# Altium footprint library LPEDT_Pulse_Project_PCB_Library.PcbLib: 34 footprints (part 3 of 3)
Each footprint in its own frame and in the unit in brackets; x right, y up, seen from the top. Pads: shape width x height; smd on the part's side, far side on the other; paste and mask are expansions set on the pad; w line width, h text height; cw(c..) or ccw(c..) is an arc to the next point about the centre after c.
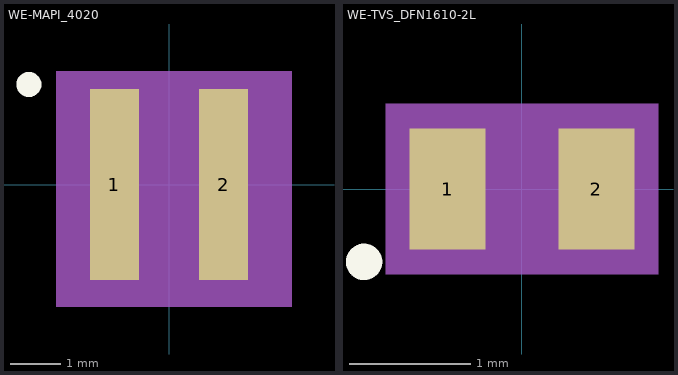
[diagram p2: the footprints below, top view; thin cyan lines are the x and y axes]

## WE-MAPI_4020 [mm]
pads (2):
  rect 0.98x3.81 smd: 1(-1.092,0) 2(1.092,0)
Top Overlay:
  circle w0.3: c-2.8,2 r0.1
Mechanical 13:
  lines w0.1: -2.05,-2.05 2.05,-2.05 2.05,2.05 -2.05,2.05 -2.05,-2.05
  lines w0.2: -2.15,-2.15 -2.15,2.15 2.15,2.15 2.15,-2.15 -2.15,-2.15
Mechanical 15:
  region: 2.452,-2.439 -2.248,-2.439 -2.248,2.261 2.452,2.261
3D body "Download_STP_WE-MAPI_4020+(rev1).stp": height 2.08, standoff -0.02, extent -2.05,-2.05 2.05,2.05

## WE-TVS_DFN1610-2L [mm]
pads (2):
  rect 0.625x1 smd: 1(-0.613,0) 2(0.613,0)
Top Overlay:
  circle w0.2: c-1.3,-0.6 r0.05
Mechanical 13:
  lines w0.1: -0.8,-0.5 0.8,-0.5 0.8,0.5 -0.8,0.5 -0.8,-0.5
Mechanical 15:
  region: 1.12,-0.7 -1.12,-0.7 -1.12,0.7 1.12,0.7
3D body "Download_STP_WE-TVS-DFN1610-2L+%28rev1%29.stp": height 0.51, standoff 0, extent -0.8,-0.5 0.8,0.5